# Altium footprint library Cty1.PcbLib: 1378 footprints (part 16 of 87)
Each footprint in its own frame and in the unit in brackets; x right, y up, seen from the top. Pads: shape width x height; smd on the part's side, far side on the other; paste and mask are expansions set on the pad; w line width, h text height; cw(c..) or ccw(c..) is an arc to the next point about the centre after c.
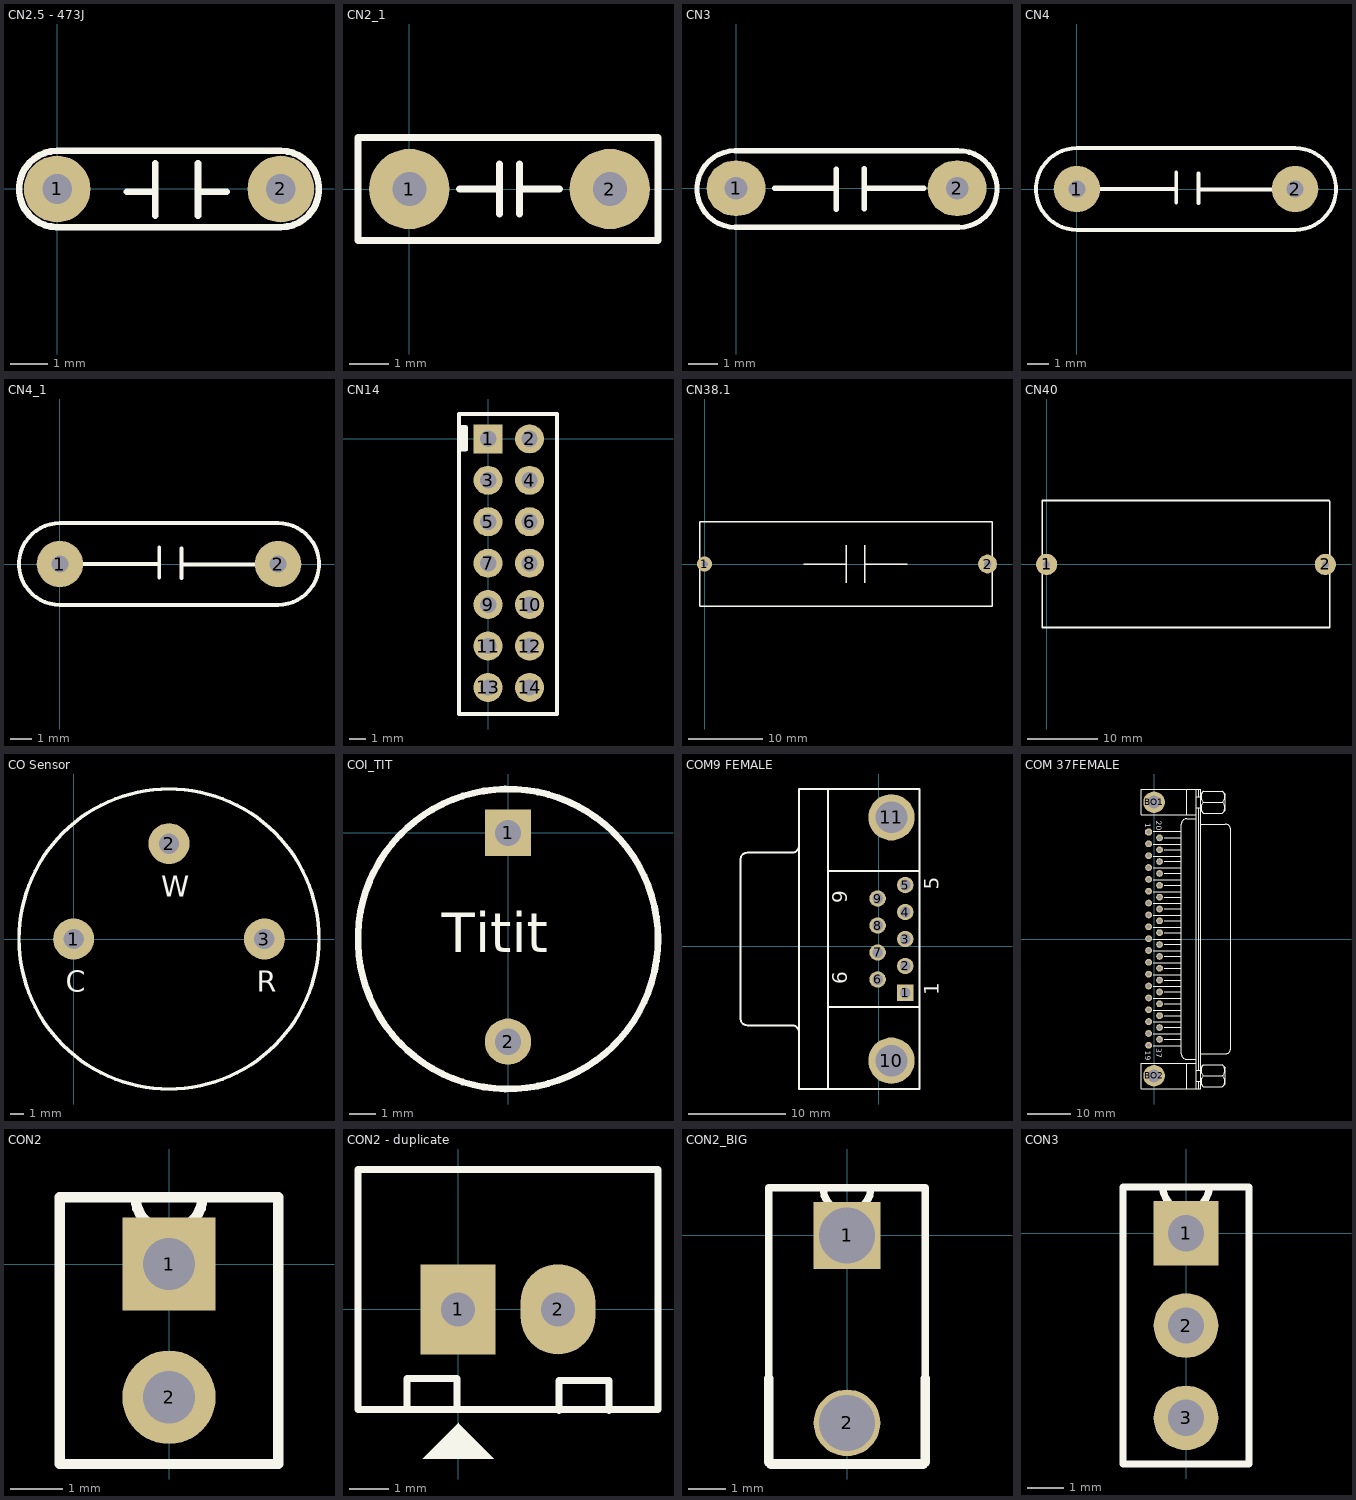
[diagram p15: the footprints below, top view; thin cyan lines are the x and y axes]

## CN2.5 - 473J [mil] "Tu pin to pin 250mil"
height 200
pads (2):
  round 70 hole 31: 1(0,0) 2(235,0)
Top Overlay:
  lines w7: -1,-40.02 235,-40.02 ccw(c235,0) 235,40 0,40 ccw(c0,0) 0,-40 ; 73,-3 103,-3 ; 103,-28 103,27 ; 148,-28 148,27 ; 148,-3 178,-3
3D body "User Library-Film Capacitor 6x8mm.STEP": height 538.62, standoff -130.41, extent -39.37,-78.74 275.59,78.74

## CN2_1 [mil]
pads (2):
  round 80 hole 34: 1(0,0) 2(200,0)
Top Overlay:
  lines w7: 50,0 60,0 90,0 ; 90,-25 90,25 ; 90,-15 90,15 ; 110,-25 110,25 ; 110,-15 110,15 ; 110,0 140,0 150,0 ; -51.18,-51.18 -51.18,51.18 248.03,51.18 248.03,-51.18 -51.18,-51.18
3D body "User Library-100n.STEP": height 349.21, standoff -131.1, extent -49.21,-49.21 246.07,49.22

## CN3 [mil] "Cap np W 0.3"
height 200
pads (2):
  oval 80x75 hole 31: 1(0,0) 2(300,0)
Top Overlay:
  lines w7: -1,-53 cw(c-1,-1) -1,51 ; 0,51 300,51 ; 1,-53 300,-53 ; 52,0 136,0 ; 136,-29 136,26 ; 174,-28 174,27 ; 174,0 255,0 ; 300.96,50.99 cw(c302,-1) 302,-53
3D body "User Library-Panasonic ECK-A3D102KBP.step": height 419.15, standoff -100, extent -7.5,-47.04 307.5,47.16

## CN4 [mil] "Cap np W 0.4"
height 200
pads (2):
  round 85 hole 31: 1(0,0) 2(400,0)
Top Overlay:
  lines w7: 44,0 182,0 ; 182,-25 182,30 ; 223,-26 223,29 ; 223,-1 360,-1 ; 399,75 0,75 ccw(c0,0) 0,-75 400,-75 ccw(c400,0) 400,75
3D body "User Library-Kondensator_5mm.STEP": height 590.55, standoff -131.06, extent -36.22,-50 436.22,48.43

## CN4_1 [mil] "Cap np W 0.4"
height 200
pads (2):
  round 85 hole 31: 1(0,0) 2(400,0)
Top Overlay:
  lines w7: 44,0 182,0 ; 182,-25 182,30 ; 223,-26 223,29 ; 223,-1 360,-1 ; 399,75 0,75 ccw(c0,0) 0,-75 400,-75 ccw(c400,0) 400,75
3D body "SW3dPS-Cap 10n - 630V Poly_2009.STEP": height 480, standoff -68.11, extent -50.2,-94.49 451.77,92.56

## CN14 [mil]
pads (14):
  rect 70x70 hole 39.37 unplated: 1(0,0)
  round 70 hole 39.37 unplated: 2(100,0) 3(0,-100) 4(100,-100) 5(0,-200) 6(100,-200) 7(0,-300) 8(100,-300) 9(0,-400) 10(100,-400) 11(0,-500) 12(100,-500) 13(0,-600) 14(100,-600)
Top Overlay:
  lines w10: -70,-26 -62,-26 ; -70,28 -62,28 ; -62,-26 -54,-26 -54,28 -62,28 ; -62,-26 -62,28 ; -70,-664 -70,60 0,60 166,60 166,-664 -70,-664

## CN38.1 [mil]
pads (2):
  round 80 hole 34: 1(0,0)
  round 100 hole 40: 2(1500,0)
Top Overlay:
  lines w7: 525,0 750,0 ; 750,-100 750,100 ; 850,-100 850,100 ; 850,0 1075,0 ; -25,-225 1525,-225 1525,225 -25,225 -25,-225
3D body "User Library-Capacitor Axial 15.STEP": height 466.54, standoff -84.65, extent -13.77,-216.53 1513.79,216.54

## CN40 [mil]
pads (2):
  round 120 hole 40: 1(0,0) 2(1570,0)
Top Overlay:
  lines w7: 1590,360 1595,355
  lines w10: 1590,360 -25,360 -25,-355 1595,-355 1595,355
3D body "User Library-ICEL CAP.STEP": height 754.33, standoff -190.55, extent -23,-353.33 1591.17,355.33

## CO Sensor [mm]
pads (3):
  round 3 hole 1.5: 1(0,0) 2(7,7) 3(14,0)
Top Overlay:
  circle w0.254: c7,0 r11
  text "R" at 13.441,-3.886 h1.52
  text "W" at 6.441,3.114 h1.52
  text "C" at -0.559,-3.886 h1.52

## COI_TIT [mil]
pads (2):
  rect 70x70 hole 39.37 unplated: 1(0,0)
  round 70 hole 39.37 unplated: 2(0,-314.96)
Top Overlay:
  circle w10: c0,-160 r226.27
  text "Titit" at -100,-180 h60

## COM9 FEMALE [mm]
pads (11):
  rect 1.69x1.69 hole 1.09: 1(2.715,-4.78)
  round 1.69 hole 1.09: 2(2.715,-2.01) 3(2.715,0.76) 4(2.715,3.53) 5(2.715,6.3) 6(-0.125,-3.395) 7(-0.125,-0.625) 8(-0.125,2.145) 9(-0.125,4.915)
  round 4.76 hole 3.26: 10(1.295,-11.735) 11(1.295,13.255)
Top Overlay:
  lines w0.2: -13.51,-8.1 cw(c-13.51,-7.405) -14.205,-7.405 -14.205,8.925 cw(c-13.51,8.925) -13.51,9.62 ; -13.505,-8.105 -8.905,-8.105 cw(c-8.905,-8.8) -8.21,-8.8 ; -13.505,9.625 -8.905,9.625 ccw(c-8.905,10.32) -8.21,10.32 ; -5.205,-14.64 -5.205,16.16 ; -5.205,-6.24 4.195,-6.24 ; -5.205,7.76 4.195,7.76 ; -8.205,-14.64 -8.205,16.16 4.195,16.16 4.195,-14.64 -8.205,-14.64
  text "6" at -3.23,-3.895 h1.5
  text "9" at -3.23,4.415 h1.5
  text "5" at 6.17,5.8 h1.5
  text "1" at 6.17,-5.03 h1.5

## COM 37FEMALE [mil] "COM 37"
pads (39):
  oct 62x62 hole 35: 1(-50,978.33)
  round 62 hole 35: 2(-50,870) 3(-50,761.67) 4(-50,653.33) 5(-50,545) 6(-50,436.67) 7(-50,328.33) 8(-50,220) 9(-50,111.67) 10(-50,3.33) 11(-50,-105) 12(-50,-213.33) 13(-50,-321.67) 14(-50,-430) 15(-50,-538.33) 16(-50,-646.67) 17(-50,-755) 18(-50,-863.33) 19(-50,-971.67) 20(50,924.17) 21(50,815.83) 22(50,707.5) 23(50,599.17) 24(50,490.83) 25(50,382.5) 26(50,274.17) 27(50,165.83) 28(50,57.5) 29(50,-50.83) 30(50,-159.17) 31(50,-267.5) 32(50,-375.83) 33(50,-484.17) 34(50,-592.5) 35(50,-700.83) 36(50,-809.17) 37(50,-917.5)
  round 196.67 hole 118.33: BO1(0,1250) BO2(0,-1250)
Top Overlay:
  lines w8: -8.33,-975 241.67,-975 250,-975 ; -8.33,-866.67 241.67,-866.67 250,-866.67 ; -8.33,-758.33 241.67,-758.33 250,-758.33 ; -8.33,-650 241.67,-650 250,-650 ; -8.33,-541.67 241.67,-541.67 250,-541.67 ; -8.33,-433.33 241.67,-433.33 250,-433.33 ; -8.33,-325 241.67,-325 250,-325 ; -8.33,-216.67 241.67,-216.67 250,-216.67 ; -8.33,-108.33 250,-108.33 ; -8.33,0 250,0 ; -8.33,108.33 241.67,108.33 250,108.33 ; -8.33,216.67 241.67,216.67 250,216.67 ; -8.33,325 241.67,325 250,325 ; -8.33,433.33 241.67,433.33 250,433.33 ; -8.33,541.67 241.67,541.67 250,541.67 ; -8.33,650 241.67,650 250,650 ; -8.33,758.33 241.67,758.33 250,758.33 ; -8.33,866.67 241.67,866.67 250,866.67 ; -8.33,983.33 250,983.33 ; 91.67,-916.67 250,-916.67 ; 91.67,-808.33 250,-808.33 ; 91.67,-700 250,-700 ; 91.67,-591.67 250,-591.67 ; 91.67,-483.33 250,-483.33 ; 91.67,-375 250,-375 ; 91.67,-266.67 250,-266.67 ; 91.67,-158.33 250,-158.33 ; 91.67,-50 250,-50 ; 91.67,58.33 250,58.33 ; 91.67,166.67 250,166.67 ; 91.67,275 250,275 ; 91.67,383.33 250,383.33 ; 91.67,491.67 250,491.67 ; 91.67,600 250,600 ; 91.67,708.33 250,708.33 ; 91.67,816.67 250,816.67 ; 91.67,925 250,925 ; 300,-1366.67 300,-1133.33 ; 300,1133.33 300,1366.67 ; 383.33,-1366.67 383.33,1366.67 ; 383.33,-1300 425,-1300 ; 383.33,-1200 425,-1200 ; 383.33,-1133.33 -116.67,-1133.33 -116.67,-1366.67 425,-1366.67 425,1366.67 -116.67,1366.67 -116.67,1133.33 383.33,1133.33 ; 383.33,-1100 300,-1100 cw(c300,-1050) 250,-1050 250,1050 cw(c300,1050) 300,1100 383.33,1100 ; 383.33,1200 425,1200 ; 383.33,1300 425,1300 ; 408.33,-1366.67 408.33,-1300 ; 408.33,-1200 408.33,1200 ; 408.33,1300 408.33,1366.67 ; 425,-1325 450,-1350 625,-1350 650,-1325 650,-1175 625,-1150 450,-1150 425,-1175 ; 425,-1050 650,-1050 ccw(c650,-1000) 700,-1000 700,1000 ccw(c650,1000) 650,1050 425,1050 ; 425,1175 450,1150 625,1150 650,1175 650,1325 625,1350 450,1350 425,1325 ; 449.91,-1350.09 cw(c500,-1300) 449.91,-1249.91 ; 449.91,-1250.09 cw(c500,-1200) 449.91,-1149.91 ; 449.91,1149.91 cw(c500,1200) 449.91,1250.09 ; 449.91,1249.91 cw(c500,1300) 449.91,1350.09 ; 450,-1250 625,-1250 ; 450,1250 625,1250 ; 625.09,-1350.09 ccw(c575,-1300) 625.09,-1249.91 ; 625.09,-1250.09 ccw(c575,-1200) 625.09,-1149.91 ; 625.09,1149.91 ccw(c575,1200) 625.09,1250.09 ; 625.09,1249.91 ccw(c575,1300) 625.09,1350.09
  text "1" at -80,1060 h50
  text "37" at 20,-1000 h50
  text "19" at -80,-1020 h50
  text "20" at 20,1080 h50

## CON2 [mil]
pads (2):
  rect 70x70 hole 39.37 unplated: 1(0,0)
  round 70 hole 39.37 unplated: 2(0,-100)
Top Overlay:
  lines w7.87: -82.09,-150 -82.09,50 25,50 cw(c0,50) -25,50 82.09,50 82.09,-150 -82.09,-150

## CON2 - duplicate [mil] "CON2"
height 200
pads (2):
  rect 75x90 hole 34: 1(0,0)
  oval 75x90 hole 34: 2(100,0)
Top Overlay:
  region: -35.5,-149.5 35.5,-149.5 0.5,-114.5 0.5,-113.5
  lines w7: -51,-99 -51,-69 -1,-69 -1,-99 ; 101,-101 101,-71 151,-71 151,-101 ; -100,-100 -100,140 200,140 200,-100 -100,-100
3D body "User Library-PCB HEADER (JST BxB-PH-K-S (VERTICAL)).STEP": height 236.22, standoff -75, extent -68.11,-70 168.11,107.17

## CON2_BIG [mil]
pads (2):
  rect 70x70 hole 59.06 unplated: 1(0,0)
  round 70 hole 59.06 unplated: 2(0,-196.85)
Top Overlay:
  lines w7.87: -82.09,-150 -82.09,50 25,50 cw(c0,50) -25,50 82.09,50 82.09,-150
  lines w10: -82.09,-150 -82.09,-237.91 -80,-240 80,-240 82.09,-237.91 82.09,-150

## CON3 [mil]
pads (3):
  rect 70x70 hole 39.37 unplated: 1(0,0)
  round 70 hole 39.37 unplated: 2(0,-100) 3(0,-200)
Top Overlay:
  lines w7.87: -68.31,-250 -68.31,50 25,50 cw(c0,50) -25,50 68.31,50 68.31,-250 -68.31,-250